# Altium footprint library ThanhNT.PcbLib: 579 footprints (part 28 of 37)
Each footprint in its own frame and in the unit in brackets; x right, y up, seen from the top. Pads: shape width x height; smd on the part's side, far side on the other; paste and mask are expansions set on the pad; w line width, h text height; cw(c..) or ccw(c..) is an arc to the next point about the centre after c.
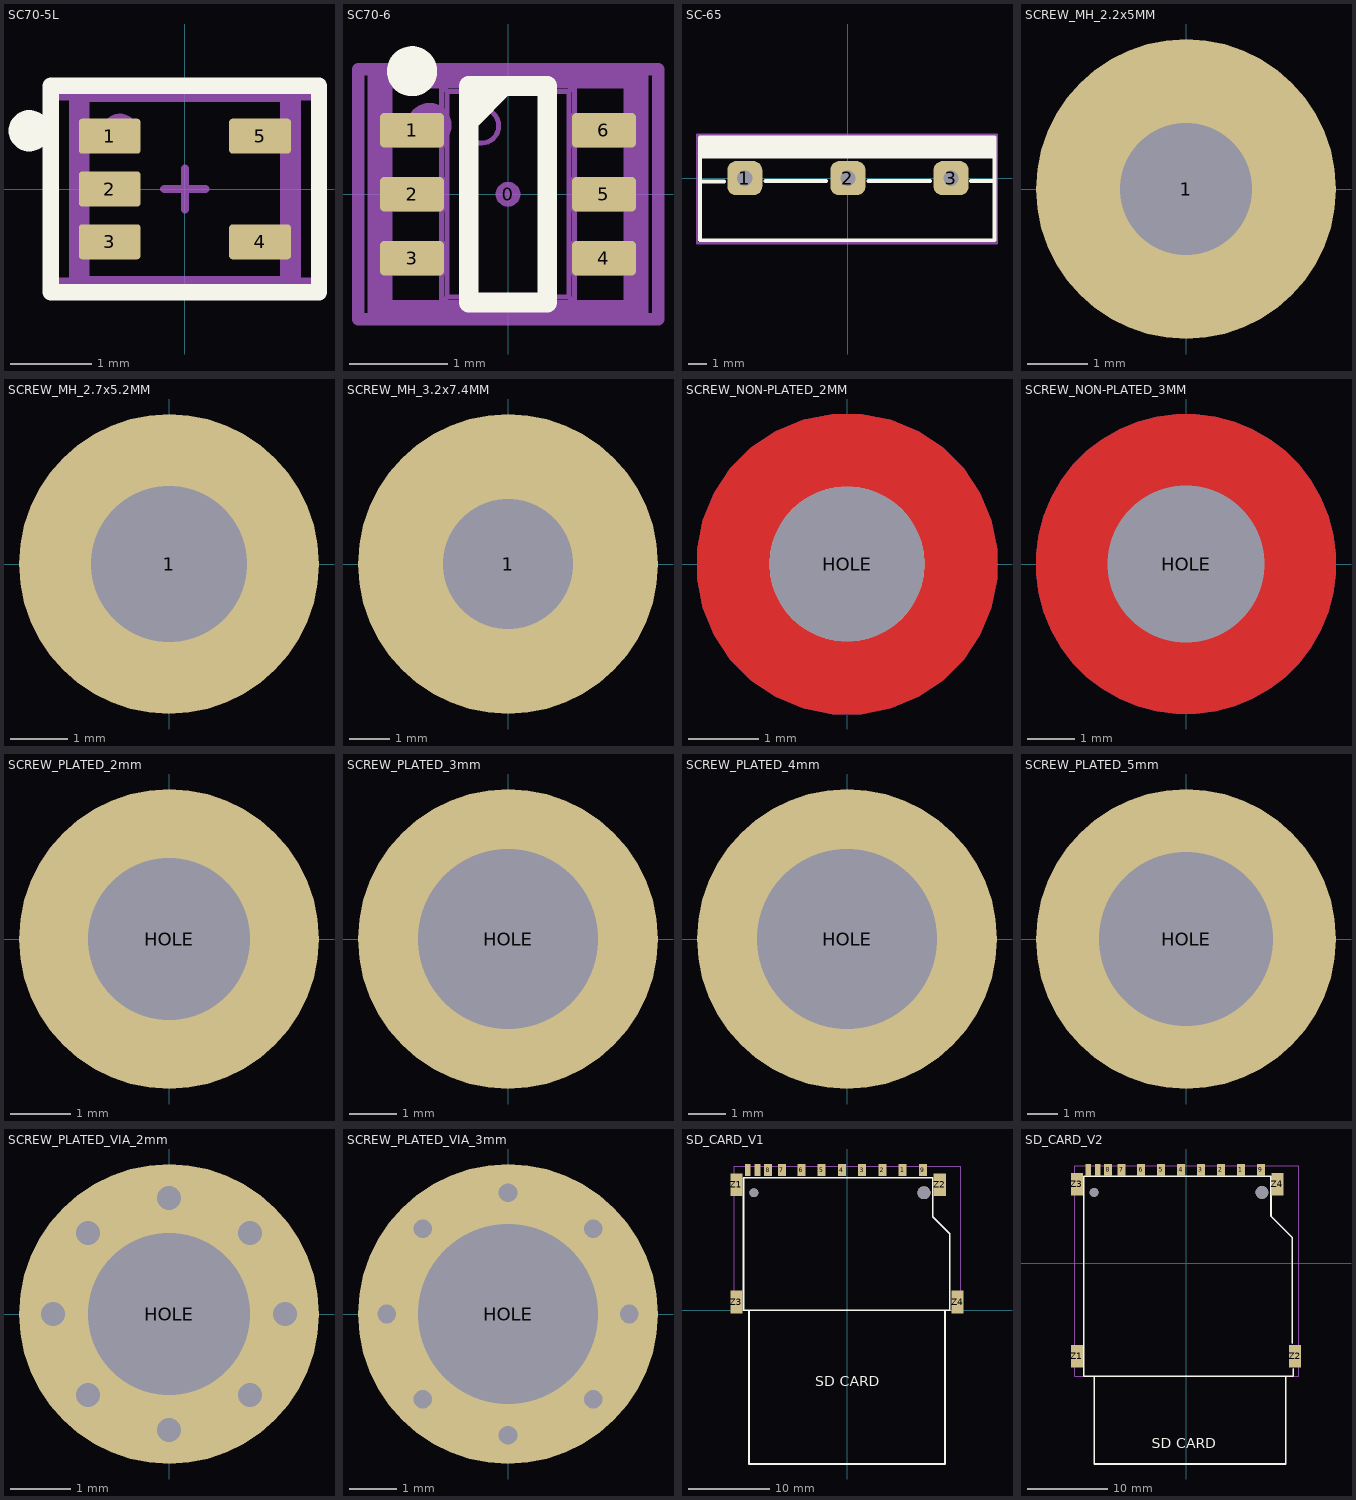
[diagram p27: the footprints below, top view; thin cyan lines are the x and y axes]

## SC70-5L [mil] "SC70, 5-Leads, Body 2.20x2.7mm, Pitch 0.65mm"
height 45.67
pads (5):
  rrect20% 30x17 smd: 1(-36.42,25.59) 2(-36.42,0) 3(-36.42,-25.59) 4(36.42,-25.59) 5(36.42,25.59)
Top Overlay:
  circle w10: c-75.39,28.21 r5
  lines w7.87: -65,-50 -65,50 65,50 65,-50 -65,-50
Mechanical 15:
  lines w3.94: -65,-45 -65,45 ; -10,0 10,0 ; 0,-10 0,10 ; 65,-45 65,45
  lines w4: -65,-45 65,-45 ; -65,45 65,45
Mechanical 16:
  circle w10: c-31.5,27.56 r3.94
  lines w10: -51.18,-47.24 51.18,-47.24 51.18,47.24 -51.18,47.24 -51.18,-47.24
3D body "WE-TVS_Standard_SC70-5L_STD.stp": height 39.37, standoff 0, extent -43.3,-39.37 43.31,39.37

## SC70-6 [mm] "SC70-6; SOT-363"
height 1.6
pads (7):
  round 0.254 on Mech15: 0(0,0)
  rrect25% 0.65x0.35 smd: 1(-0.975,0.65) 2(-0.975,0) 3(-0.975,-0.65) 4(0.975,-0.65) 5(0.975,0) 6(0.975,0.65)
Top Overlay:
  circle w0.254: c-0.975,1.25 r0.127
  region: 0.1,1.1 -0.4,0.6 -0.4,1.1
  lines w0.2: -0.4,-1.1 0.4,-1.1 0.4,1.1 -0.4,1.1 -0.4,-1.1
Mechanical 13:
  circle w0.05: c-0.27,0.695 r0.175
  lines w0.05: -1.028,-0.8 -1.028,-0.5 ; -1.028,-0.15 -1.028,0.15 ; -1.028,0.5 -1.028,0.8 ; -0.937,-0.8 -0.937,-0.5 ; -0.937,-0.15 -0.937,0.15 ; -0.937,0.5 -0.937,0.8 ; -0.925,-0.8 -0.925,-0.5 ; -0.925,-0.15 -0.925,0.15 ; -0.925,0.5 -0.925,0.8 ; 0.925,-0.8 0.925,-0.5 ; 0.925,-0.15 0.925,0.15 ; 0.925,0.5 0.925,0.8 ; 0.937,-0.8 0.937,-0.5 ; 0.937,-0.15 0.937,0.15 ; 0.937,0.5 0.937,0.8 ; 1.028,-0.8 1.028,-0.5 ; 1.028,-0.15 1.028,0.15 ; 1.028,0.5 1.028,0.8 ; -0.675,-1.1 -0.619,-1.044 ; -0.675,-1.1 -0.675,1.1 ; -0.675,-1.1 0.675,-1.1 ; -0.675,1.1 -0.619,1.044 ; -0.675,1.1 0.675,1.1 ; -0.619,-1.044 -0.619,1.044 ; -0.619,-1.044 0.619,-1.044 ; -0.619,1.044 0.619,1.044 ; 0.619,-1.044 0.619,1.044 ; 0.619,-1.044 0.675,-1.1 ; 0.619,1.044 0.675,1.1 ; 0.675,-1.1 0.675,1.1 ; -1.2,-0.8 -0.654,-0.8 -0.654,-0.5 -1.2,-0.5 -1.2,-0.8 ; -1.2,-0.15 -0.654,-0.15 -0.654,0.15 -1.2,0.15 -1.2,-0.15 ; -1.2,0.5 -0.654,0.5 -0.654,0.8 -1.2,0.8 -1.2,0.5 ; 0.654,-0.8 0.654,-0.5 1.2,-0.5 1.2,-0.8 0.654,-0.8 ; 0.654,-0.15 0.654,0.15 1.2,0.15 1.2,-0.15 0.654,-0.15 ; 0.654,0.5 0.654,0.8 1.2,0.8 1.2,0.5 0.654,0.5
Mechanical 15:
  lines w0.127: -1.524,-1.27 1.524,-1.27 1.524,1.27 -1.524,1.27 -1.524,-1.27
Mechanical 16:
  circle w0.254: c-0.8,0.7 r0.1
  lines w0.254: -1.3,-1.2 1.3,-1.2 1.3,1.2 -1.3,1.2 -1.3,-1.2
3D body "SOT363.STEP": height 1.1, standoff 0, extent -1.2,-1.1 1.2,1.1

## SC-65 [mm]
pads (3):
  rrect50% 1.85x1.8 hole 0.8 square: 1(-5.45,0) 2(0,0) 3(5.45,0)
Top Overlay:
  rectangle: -7.823,1.041 7.722,2.159
  lines w0.2: -7.823,0.47 -7.823,0.508 ; -7.823,0.914 -7.823,1.016 ; -7.798,-0.178 -6.553,-0.178 ; -4.369,-0.152 -1.143,-0.152 ; 1.092,-0.152 4.343,-0.152 ; 6.502,-0.152 7.747,-0.152 ; -7.823,-3.277 7.747,-3.277 7.747,2.159 -7.823,2.159 -7.823,-3.277
Mechanical 15:
  lines w0.127: -7.976,-3.429 7.874,-3.429 7.874,2.286 -7.976,2.286 -7.976,-3.429
3D body "User Library-TO247.STEP": height 14.69, standoff -27.22, extent -8.181,-3.116 8.079,2.184

## SCREW_MH_2.2x5MM [mm]
pads (1):
  round 5 / inner round 3.683 / far side round 5 hole 2.2: 1(0,0)

## SCREW_MH_2.7x5.2MM [mm]
pads (1):
  round 5.2 / inner round 3.683 / far side round 5.2 hole 2.7: 1(0,0)

## SCREW_MH_3.2x7.4MM [mm]
pads (1):
  round 7.4 / inner round 3.683 / far side round 7.4 hole 3.2 mask+0.025: 1(0,0)

## SCREW_NON-PLATED_2MM [mm]
pads (1):
  round 2.2 hole 2.2 unplated paste+1 mask+1: HOLE(0,0)
Top Layer:
  pour cut-out: 0,-2.127 -0.209,-2.127 -0.62,-2.045 -1.007,-1.885 -1.356,-1.652 -1.652,-1.356 -1.885,-1.007 -2.045,-0.62 -2.127,-0.209 -2.127,0 -2.127,0.209 -2.045,0.62 -1.885,1.007 -1.652,1.356 -1.356,1.652 -1.007,1.885 -0.62,2.045 -0.209,2.127 0,2.127 0.209,2.127 0.62,2.045 1.007,1.885 1.356,1.652 1.652,1.356 1.885,1.007 2.045,0.62 2.127,0.209 2.127,0 2.127,-0.209 2.045,-0.62 1.885,-1.007 1.652,-1.356 1.356,-1.652 1.007,-1.885 0.62,-2.045 0.209,-2.127
Bottom Layer:
  pour cut-out: 0,-2.127 -0.209,-2.127 -0.62,-2.045 -1.007,-1.885 -1.356,-1.652 -1.652,-1.356 -1.885,-1.007 -2.045,-0.62 -2.127,-0.209 -2.127,0 -2.127,0.209 -2.045,0.62 -1.885,1.007 -1.652,1.356 -1.356,1.652 -1.007,1.885 -0.62,2.045 -0.209,2.127 0,2.127 0.209,2.127 0.62,2.045 1.007,1.885 1.356,1.652 1.652,1.356 1.885,1.007 2.045,0.62 2.127,0.209 2.127,0 2.127,-0.209 2.045,-0.62 1.885,-1.007 1.652,-1.356 1.356,-1.652 1.007,-1.885 0.62,-2.045 0.209,-2.127

## SCREW_NON-PLATED_3MM [mm]
pads (1):
  round 3.2 hole 3.3 unplated mask+1.5: HOLE(0,0)
Top Layer:
  pour cut-out: 0,-3.16 -0.207,-3.16 -0.618,-3.106 -1.018,-2.999 -1.401,-2.84 -1.759,-2.633 -2.088,-2.381 -2.381,-2.088 -2.633,-1.759 -2.84,-1.401 -2.999,-1.018 -3.106,-0.618 -3.16,-0.207 -3.16,0 -3.16,0.207 -3.106,0.618 -2.999,1.018 -2.84,1.401 -2.633,1.759 -2.381,2.088 -2.088,2.381 -1.759,2.633 -1.401,2.84 -1.018,2.999 -0.618,3.106 -0.207,3.16 0,3.16 0.207,3.16 0.618,3.106 1.018,2.999 1.401,2.84 1.759,2.633 2.088,2.381 2.381,2.088 2.633,1.759 2.84,1.401 2.999,1.018 3.106,0.618 3.16,0.207 3.16,0 3.16,-0.207 3.106,-0.618 2.999,-1.018 2.84,-1.401 2.633,-1.759 2.381,-2.088 2.088,-2.381 1.759,-2.633 1.401,-2.84 1.018,-2.999 0.618,-3.106 0.207,-3.16
Bottom Layer:
  pour cut-out: 0,-3.16 -0.207,-3.16 -0.618,-3.106 -1.018,-2.999 -1.401,-2.84 -1.759,-2.633 -2.088,-2.381 -2.381,-2.088 -2.633,-1.759 -2.84,-1.401 -2.999,-1.018 -3.106,-0.618 -3.16,-0.207 -3.16,0 -3.16,0.207 -3.106,0.618 -2.999,1.018 -2.84,1.401 -2.633,1.759 -2.381,2.088 -2.088,2.381 -1.759,2.633 -1.401,2.84 -1.018,2.999 -0.618,3.106 -0.207,3.16 0,3.16 0.207,3.16 0.618,3.106 1.018,2.999 1.401,2.84 1.759,2.633 2.088,2.381 2.381,2.088 2.633,1.759 2.84,1.401 2.999,1.018 3.106,0.618 3.16,0.207 3.16,0 3.16,-0.207 3.106,-0.618 2.999,-1.018 2.84,-1.401 2.633,-1.759 2.381,-2.088 2.088,-2.381 1.759,-2.633 1.401,-2.84 1.018,-2.999 0.618,-3.106 0.207,-3.16

## SCREW_PLATED_2mm [mm] "ISO14583 M2x4 (d=2mm, L=4mm)"
pads (1):
  round 5 hole 2.7: HOLE(0,0)
3D body "User Library-Screw ISO 14583ISO 14583 - M2 x 4.STEP": height 1.62, standoff -3.99, extent -1.994,-1.993 1.996,1.994

## SCREW_PLATED_3mm [mm] "ISO14583 M3x5 (d=3mm, L=5mm)"
pads (1):
  round 6.35 hole 3.81: HOLE(0,0)
3D body "User Library-Screw ISO 14583ISO 14583 - M3 x 5.STEP": height 2.42, standoff -4.99, extent -2.792,-2.791 2.794,2.791

## SCREW_PLATED_4mm [mm] "ISO14583 M4x6 (d=4mm, L=6mm)"
pads (1):
  round 8 hole 4.8: HOLE(0,0)
3D body "User Library-Screw ISO 14583ISO 14583 - M4 x 6.STEP": height 3.12, standoff -5.99, extent -3.993,-3.991 3.994,3.991

## SCREW_PLATED_5mm [mm] "ISO14583 M5x6 (d=5mm, L=6mm)"
pads (1):
  round 10 hole 5.8: HOLE(0,0)
3D body "User Library-Screw ISO 14583ISO 14583 - M5 x 6.STEP": height 3.72, standoff -5.98, extent -4.743,-4.741 4.744,4.741

## SCREW_PLATED_VIA_2mm [mm] "ISO14583 M2x4 (d=2mm, L=4mm)"
pads (1):
  round 5 hole 2.7: HOLE(0,0)
via -1.346,1.346 diameter 0.7 hole 0.4
via 0,1.929 diameter 0.7 hole 0.4
via 1.346,1.346 diameter 0.7 hole 0.4
via 1.929,0 diameter 0.7 hole 0.4
via 1.346,-1.346 diameter 0.7 hole 0.4
via 0,-1.929 diameter 0.7 hole 0.4
via -1.346,-1.346 diameter 0.7 hole 0.4
via -1.929,0 diameter 0.7 hole 0.4

## SCREW_PLATED_VIA_3mm [mm] "ISO14583 M3x5 (d=3mm, L=5mm)"
pads (1):
  round 6.35 hole 3.81: HOLE(0,0)
via -2.565,0 diameter 0.7 hole 0.4
via -1.803,-1.803 diameter 0.7 hole 0.4
via 0,-2.565 diameter 0.7 hole 0.4
via 1.803,-1.803 diameter 0.7 hole 0.4
via 2.565,0 diameter 0.7 hole 0.4
via 1.803,1.803 diameter 0.7 hole 0.4
via 0,2.565 diameter 0.7 hole 0.4
via -1.803,1.803 diameter 0.7 hole 0.4

## SD_CARD_V1 [mm] "WR-CRD SD_Push and Pull_Short Version with Card Detection_9 pins"
height 2.8
pads (17):
  rect 1x1.5 smd: 1(6.825,17.297) 2(4.325,17.297) 3(1.825,17.297) 4(-0.675,17.297) 5(-3.175,17.297) 6(-5.675,17.297) 7(-8.1,17.297) 8(-9.8,17.297) 9(9.325,17.297)
  rect 0.7x1.5 smd: CD(-11.1,17.297) WP(-12.3,17.297)
  rect 1.5x2.8 smd: Z1(-13.7,15.497) Z2(11.4,15.497) Z3(-13.7,0.997) Z4(13.6,0.997)
  round 1.1 hole 1.1 unplated: ""(-11.55,14.497)
  round 1.6 hole 1.6 unplated: ""(9.45,14.497)
Top Overlay:
  lines w0.2: -12.827,0 -12.827,16.332 10.541,16.332 10.541,11.531 12.649,9.422 12.649,0 -12.827,0 ; -12.15,-19 12.05,-19 12.05,0 -12.15,0 -12.15,-19
  text "SD CARD" at -3.95,-9.378 h1.27
Mechanical 13:
  lines w0.127: -14,0 -14,17.75 14,17.75 14,0 -14,0
  text "WP" at -11.895,18.462 h0.8
  text "CD" at -10.65,18.422 h0.8
  text "1" at 6.65,18.322 h0.8
  text "9" at 9.05,18.322 h0.8
  text "8" at -9.75,18.522 h0.8
3D body "693063020911.stp": height 2.81, standoff -0.84, extent -14,0 14,17.75

## SD_CARD_V2 [mm] "WR-CRD SD_Push and Pull_with card detection_9 pins"
height 3.3
pads (17):
  rect 1x1.5 smd: 1(6.875,11.65) 2(4.375,11.65) 3(1.875,11.65) 4(-0.625,11.65) 5(-3.125,11.65) 6(-5.625,11.65) 7(-8.05,11.65) 8(-9.75,11.65) 9(9.375,11.65)
  rect 0.7x1.5 smd: CDI(-11.05,11.65) WP(-12.25,11.65)
  rect 1.5x2.8 smd: Z1(-13.65,-11.65) Z2(13.65,-11.65) Z3(-13.65,9.85) Z4(11.45,9.85)
  round 1.1 hole 1.1 unplated: ""(-11.5,8.85)
  round 1.6 hole 1.6 unplated: ""(9.5,8.85)
Top Overlay:
  lines w0.2: -11.5,-14.15 -11.5,-25.15 12.5,-25.15 12.5,-14.15 ; 13.284,-10.033 13.284,3.2 13.3,3.2 10.643,5.857 10.643,10.85 -12.802,10.85 -12.802,-14.15 13.3,-14.15 13.437,-14.15 13.437,-13.233
  text "SD CARD" at -4.3,-23.15 h1.27
Mechanical 13:
  lines w0.127: -13.95,-14.15 14.094,-14.15 14.094,12.15 -13.95,12.15 -13.95,-14.15
  text "WP" at -11.845,12.815 h0.8
  text "CDI" at -10.6,12.775 h0.8
  text "1" at 6.7,12.75 h0.8
  text "9" at 9.1,12.75 h0.8
  text "8" at -10,12.85 h0.8
3D body "693063010911.stp": height 3.3, standoff -0.8, extent -13.95,-14.15 14.094,12.15